# Altium footprint library CONN_TBLOCK_3P5_B.PcbLib: 36 footprints (part 2 of 3)
Each footprint in its own frame and in the unit in brackets; x right, y up, seen from the top. Pads: shape width x height; smd on the part's side, far side on the other; paste and mask are expansions set on the pad; w line width, h text height; cw(c..) or ccw(c..) is an arc to the next point about the centre after c.
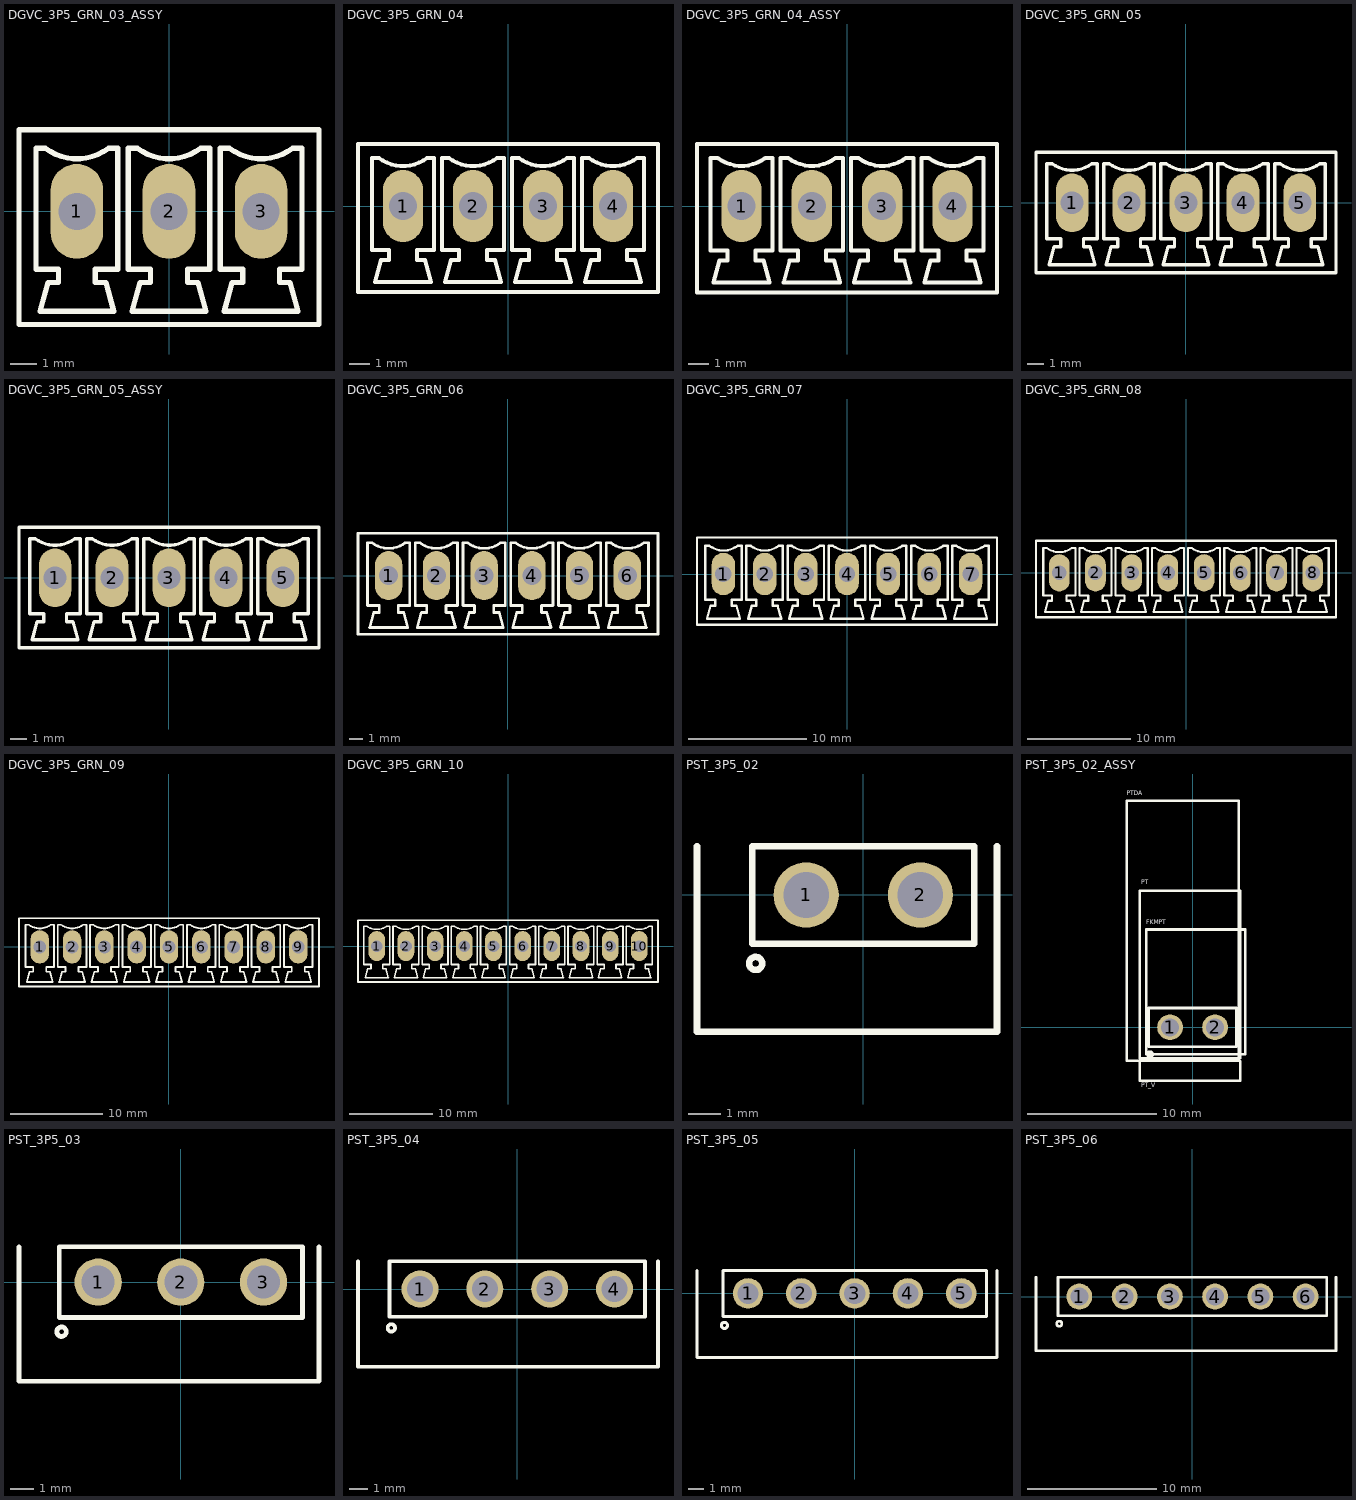
[diagram p1: the footprints below, top view; thin cyan lines are the x and y axes]

## DGVC_3P5_GRN_03_ASSY [mm] "Terminal Block Pluggable, 15EDGVC-3.5-0xP-14, Green, 8A/300v"
pads (3):
  oval 2x3.6 hole 1.4: 1(-3.5,0) 2(0,0) 3(3.5,0)
Top Overlay:
  lines w0.2: -4.25,-2.2 -5.05,-2.2 -5.05,2.4 -4.7,2.4 ccw(c-3.5,4) -2.3,2.4 -1.95,2.4 -1.95,-2.2 -2.8,-2.2 -2.8,-2.7 -2.4,-2.7 -2.1,-3.8 -4.9,-3.8 -4.6,-2.7 -4.2,-2.7 -4.2,-2.2 ; -0.75,-2.2 -1.55,-2.2 -1.55,2.4 -1.2,2.4 ccw(c0,4) 1.2,2.4 1.55,2.4 1.55,-2.2 0.7,-2.2 0.7,-2.7 1.1,-2.7 1.4,-3.8 -1.4,-3.8 -1.1,-2.7 -0.7,-2.7 -0.7,-2.2 ; 2.75,-2.2 1.95,-2.2 1.95,2.4 2.3,2.4 ccw(c3.5,4) 4.7,2.4 5.05,2.4 5.05,-2.2 4.2,-2.2 4.2,-2.7 4.6,-2.7 4.9,-3.8 2.1,-3.8 2.4,-2.7 2.8,-2.7 2.8,-2.2 ; -5.7,-4.3 5.7,-4.3 5.7,3.1 -5.7,3.1 -5.7,-4.3
3D body "15EDG-3.5-3P(V-Hhb).STEP": height 21.7, standoff -3.6, extent -5.678,-5.108 5.622,5.292

## DGVC_3P5_GRN_04 [mm] "Terminal Block Pluggable, 15EDGVC-3.5-0xP-14, Green, 8A/300v"
pads (4):
  oval 2x3.6 hole 1.4: 1(-5.25,0) 2(-1.75,0) 3(1.75,0) 4(5.25,0)
Top Overlay:
  lines w0.2: -6,-2.2 -6.8,-2.2 -6.8,2.4 -6.45,2.4 ccw(c-5.25,4) -4.05,2.4 -3.7,2.4 -3.7,-2.2 -4.55,-2.2 -4.55,-2.7 -4.15,-2.7 -3.85,-3.8 -6.65,-3.8 -6.35,-2.7 -5.95,-2.7 -5.95,-2.2 ; -2.5,-2.2 -3.3,-2.2 -3.3,2.4 -2.95,2.4 ccw(c-1.75,4) -0.55,2.4 -0.2,2.4 -0.2,-2.2 -1.05,-2.2 -1.05,-2.7 -0.65,-2.7 -0.35,-3.8 -3.15,-3.8 -2.85,-2.7 -2.45,-2.7 -2.45,-2.2 ; 1,-2.2 0.2,-2.2 0.2,2.4 0.55,2.4 ccw(c1.75,4) 2.95,2.4 3.3,2.4 3.3,-2.2 2.45,-2.2 2.45,-2.7 2.85,-2.7 3.15,-3.8 0.35,-3.8 0.65,-2.7 1.05,-2.7 1.05,-2.2 ; 4.5,-2.2 3.7,-2.2 3.7,2.4 4.05,2.4 ccw(c5.25,4) 6.45,2.4 6.8,2.4 6.8,-2.2 5.95,-2.2 5.95,-2.7 6.35,-2.7 6.65,-3.8 3.85,-3.8 4.15,-2.7 4.55,-2.7 4.55,-2.2 ; -7.5,-4.3 7.5,-4.3 7.5,3.1 -7.5,3.1 -7.5,-4.3
3D body "15EDGVC-3.5-04P-14-00AH.STEP": height 9.2, standoff -3.6, extent -7.403,-4.235 7.397,2.965

## DGVC_3P5_GRN_04_ASSY [mm] "Terminal Block Pluggable, 15EDGVC-3.5-0xP-14, Green, 8A/300v"
pads (4):
  oval 2x3.6 hole 1.4: 1(-5.25,0) 2(-1.75,0) 3(1.75,0) 4(5.25,0)
Top Overlay:
  lines w0.2: -6,-2.2 -6.8,-2.2 -6.8,2.4 -6.45,2.4 ccw(c-5.25,4) -4.05,2.4 -3.7,2.4 -3.7,-2.2 -4.55,-2.2 -4.55,-2.7 -4.15,-2.7 -3.85,-3.8 -6.65,-3.8 -6.35,-2.7 -5.95,-2.7 -5.95,-2.2 ; -2.5,-2.2 -3.3,-2.2 -3.3,2.4 -2.95,2.4 ccw(c-1.75,4) -0.55,2.4 -0.2,2.4 -0.2,-2.2 -1.05,-2.2 -1.05,-2.7 -0.65,-2.7 -0.35,-3.8 -3.15,-3.8 -2.85,-2.7 -2.45,-2.7 -2.45,-2.2 ; 1,-2.2 0.2,-2.2 0.2,2.4 0.55,2.4 ccw(c1.75,4) 2.95,2.4 3.3,2.4 3.3,-2.2 2.45,-2.2 2.45,-2.7 2.85,-2.7 3.15,-3.8 0.35,-3.8 0.65,-2.7 1.05,-2.7 1.05,-2.2 ; 4.5,-2.2 3.7,-2.2 3.7,2.4 4.05,2.4 ccw(c5.25,4) 6.45,2.4 6.8,2.4 6.8,-2.2 5.95,-2.2 5.95,-2.7 6.35,-2.7 6.65,-3.8 3.85,-3.8 4.15,-2.7 4.55,-2.7 4.55,-2.2 ; -7.465,-4.3 7.465,-4.3 7.465,3.1 -7.465,3.1 -7.465,-4.3
3D body "15EDG-3.5-4P(V-Hhb).STEP": height 21.7, standoff -3.6, extent -7.401,-5.235 7.399,5.165

## DGVC_3P5_GRN_05 [mm] "Terminal Block Pluggable, 15EDGVC-3.5-0xP-14, Green, 8A/300v"
pads (5):
  oval 2x3.6 hole 1.4: 1(-7,0) 2(-3.5,0) 3(0,0) 4(3.5,0) 5(7,0)
Top Overlay:
  lines w0.2: -7.75,-2.2 -8.55,-2.2 -8.55,2.4 -8.2,2.4 ccw(c-7,4) -5.8,2.4 -5.45,2.4 -5.45,-2.2 -6.3,-2.2 -6.3,-2.7 -5.9,-2.7 -5.6,-3.8 -8.4,-3.8 -8.1,-2.7 -7.7,-2.7 -7.7,-2.2 ; -4.25,-2.2 -5.05,-2.2 -5.05,2.4 -4.7,2.4 ccw(c-3.5,4) -2.3,2.4 -1.95,2.4 -1.95,-2.2 -2.8,-2.2 -2.8,-2.7 -2.4,-2.7 -2.1,-3.8 -4.9,-3.8 -4.6,-2.7 -4.2,-2.7 -4.2,-2.2 ; -0.75,-2.2 -1.55,-2.2 -1.55,2.4 -1.2,2.4 ccw(c0,4) 1.2,2.4 1.55,2.4 1.55,-2.2 0.7,-2.2 0.7,-2.7 1.1,-2.7 1.4,-3.8 -1.4,-3.8 -1.1,-2.7 -0.7,-2.7 -0.7,-2.2 ; 2.75,-2.2 1.95,-2.2 1.95,2.4 2.3,2.4 ccw(c3.5,4) 4.7,2.4 5.05,2.4 5.05,-2.2 4.2,-2.2 4.2,-2.7 4.6,-2.7 4.9,-3.8 2.1,-3.8 2.4,-2.7 2.8,-2.7 2.8,-2.2 ; 6.25,-2.2 5.45,-2.2 5.45,2.4 5.8,2.4 ccw(c7,4) 8.2,2.4 8.55,2.4 8.55,-2.2 7.7,-2.2 7.7,-2.7 8.1,-2.7 8.4,-3.8 5.6,-3.8 5.9,-2.7 6.3,-2.7 6.3,-2.2 ; -9.215,-4.3 9.215,-4.3 9.215,3.1 -9.215,3.1 -9.215,-4.3
3D body "15EDGVC-3.5-05P-14-00AH.STEP": height 9.2, standoff -3.6, extent -9.151,-4.21 9.149,2.99

## DGVC_3P5_GRN_05_ASSY [mm] "Terminal Block Pluggable, 15EDGVC-3.5-0xP-14, Green, 8A/300v"
pads (5):
  oval 2x3.6 hole 1.4: 1(-7,0) 2(-3.5,0) 3(0,0) 4(3.5,0) 5(7,0)
Top Overlay:
  lines w0.2: -7.75,-2.2 -8.55,-2.2 -8.55,2.4 -8.2,2.4 ccw(c-7,4) -5.8,2.4 -5.45,2.4 -5.45,-2.2 -6.3,-2.2 -6.3,-2.7 -5.9,-2.7 -5.6,-3.8 -8.4,-3.8 -8.1,-2.7 -7.7,-2.7 -7.7,-2.2 ; -4.25,-2.2 -5.05,-2.2 -5.05,2.4 -4.7,2.4 ccw(c-3.5,4) -2.3,2.4 -1.95,2.4 -1.95,-2.2 -2.8,-2.2 -2.8,-2.7 -2.4,-2.7 -2.1,-3.8 -4.9,-3.8 -4.6,-2.7 -4.2,-2.7 -4.2,-2.2 ; -0.75,-2.2 -1.55,-2.2 -1.55,2.4 -1.2,2.4 ccw(c0,4) 1.2,2.4 1.55,2.4 1.55,-2.2 0.7,-2.2 0.7,-2.7 1.1,-2.7 1.4,-3.8 -1.4,-3.8 -1.1,-2.7 -0.7,-2.7 -0.7,-2.2 ; 2.75,-2.2 1.95,-2.2 1.95,2.4 2.3,2.4 ccw(c3.5,4) 4.7,2.4 5.05,2.4 5.05,-2.2 4.2,-2.2 4.2,-2.7 4.6,-2.7 4.9,-3.8 2.1,-3.8 2.4,-2.7 2.8,-2.7 2.8,-2.2 ; 6.25,-2.2 5.45,-2.2 5.45,2.4 5.8,2.4 ccw(c7,4) 8.2,2.4 8.55,2.4 8.55,-2.2 7.7,-2.2 7.7,-2.7 8.1,-2.7 8.4,-3.8 5.6,-3.8 5.9,-2.7 6.3,-2.7 6.3,-2.2 ; -9.215,-4.3 -9.215,3.1 9.215,3.1 9.215,-4.3 -9.215,-4.3
3D body "15EDG-3.5-5P(V-Hhb).STEP": height 21.7, standoff -3.6, extent -9.135,-5.207 9.165,5.193

## DGVC_3P5_GRN_06 [mm] "Terminal Block Pluggable, 15EDGVC-3.5-0xP-14, Green, 8A/300v"
pads (6):
  oval 2x3.6 hole 1.4: 1(-8.75,0) 2(-5.25,0) 3(-1.75,0) 4(1.75,0) 5(5.25,0) 6(8.75,0)
Top Overlay:
  lines w0.2: -9.5,-2.2 -10.3,-2.2 -10.3,2.4 -9.95,2.4 ccw(c-8.75,4) -7.55,2.4 -7.2,2.4 -7.2,-2.2 -8.05,-2.2 -8.05,-2.7 -7.65,-2.7 -7.35,-3.8 -10.15,-3.8 -9.85,-2.7 -9.45,-2.7 -9.45,-2.2 ; -6,-2.2 -6.8,-2.2 -6.8,2.4 -6.45,2.4 ccw(c-5.25,4) -4.05,2.4 -3.7,2.4 -3.7,-2.2 -4.55,-2.2 -4.55,-2.7 -4.15,-2.7 -3.85,-3.8 -6.65,-3.8 -6.35,-2.7 -5.95,-2.7 -5.95,-2.2 ; -2.5,-2.2 -3.3,-2.2 -3.3,2.4 -2.95,2.4 ccw(c-1.75,4) -0.55,2.4 -0.2,2.4 -0.2,-2.2 -1.05,-2.2 -1.05,-2.7 -0.65,-2.7 -0.35,-3.8 -3.15,-3.8 -2.85,-2.7 -2.45,-2.7 -2.45,-2.2 ; 1,-2.2 0.2,-2.2 0.2,2.4 0.55,2.4 ccw(c1.75,4) 2.95,2.4 3.3,2.4 3.3,-2.2 2.45,-2.2 2.45,-2.7 2.85,-2.7 3.15,-3.8 0.35,-3.8 0.65,-2.7 1.05,-2.7 1.05,-2.2 ; 4.5,-2.2 3.7,-2.2 3.7,2.4 4.05,2.4 ccw(c5.25,4) 6.45,2.4 6.8,2.4 6.8,-2.2 5.95,-2.2 5.95,-2.7 6.35,-2.7 6.65,-3.8 3.85,-3.8 4.15,-2.7 4.55,-2.7 4.55,-2.2 ; 8,-2.2 7.2,-2.2 7.2,2.4 7.55,2.4 ccw(c8.75,4) 9.95,2.4 10.3,2.4 10.3,-2.2 9.45,-2.2 9.45,-2.7 9.85,-2.7 10.15,-3.8 7.35,-3.8 7.65,-2.7 8.05,-2.7 8.05,-2.2 ; -11,-4.3 11,-4.3 11,3.1 -11,3.1 -11,-4.3
3D body "15EDGVC-3.5-03P-14-00AH.STEP": height 9.2, standoff -3.6, extent -0.403,-4.208 10.897,2.992
3D body "15EDGVC-3.5-03P-14-00AH.STEP": height 9.2, standoff -3.6, extent -10.903,-4.208 0.397,2.992

## DGVC_3P5_GRN_07 [mm] "Terminal Block Pluggable, 15EDGVC-3.5-0xP-14, Green, 8A/300v"
pads (7):
  oval 2x3.6 hole 1.4: 1(-10.5,0) 2(-7,0) 3(-3.5,0) 4(0,0) 5(3.5,0) 6(7,0) 7(10.5,0)
Top Overlay:
  lines w0.2: -11.25,-2.2 -12.05,-2.2 -12.05,2.4 -11.7,2.4 ccw(c-10.5,4) -9.3,2.4 -8.95,2.4 -8.95,-2.2 -9.8,-2.2 -9.8,-2.7 -9.4,-2.7 -9.1,-3.8 -11.9,-3.8 -11.6,-2.7 -11.2,-2.7 -11.2,-2.2 ; -7.75,-2.2 -8.55,-2.2 -8.55,2.4 -8.2,2.4 ccw(c-7,4) -5.8,2.4 -5.45,2.4 -5.45,-2.2 -6.3,-2.2 -6.3,-2.7 -5.9,-2.7 -5.6,-3.8 -8.4,-3.8 -8.1,-2.7 -7.7,-2.7 -7.7,-2.2 ; -4.25,-2.2 -5.05,-2.2 -5.05,2.4 -4.7,2.4 ccw(c-3.5,4) -2.3,2.4 -1.95,2.4 -1.95,-2.2 -2.8,-2.2 -2.8,-2.7 -2.4,-2.7 -2.1,-3.8 -4.9,-3.8 -4.6,-2.7 -4.2,-2.7 -4.2,-2.2 ; -0.75,-2.2 -1.55,-2.2 -1.55,2.4 -1.2,2.4 ccw(c0,4) 1.2,2.4 1.55,2.4 1.55,-2.2 0.7,-2.2 0.7,-2.7 1.1,-2.7 1.4,-3.8 -1.4,-3.8 -1.1,-2.7 -0.7,-2.7 -0.7,-2.2 ; 2.75,-2.2 1.95,-2.2 1.95,2.4 2.3,2.4 ccw(c3.5,4) 4.7,2.4 5.05,2.4 5.05,-2.2 4.2,-2.2 4.2,-2.7 4.6,-2.7 4.9,-3.8 2.1,-3.8 2.4,-2.7 2.8,-2.7 2.8,-2.2 ; 6.25,-2.2 5.45,-2.2 5.45,2.4 5.8,2.4 ccw(c7,4) 8.2,2.4 8.55,2.4 8.55,-2.2 7.7,-2.2 7.7,-2.7 8.1,-2.7 8.4,-3.8 5.6,-3.8 5.9,-2.7 6.3,-2.7 6.3,-2.2 ; 9.75,-2.2 8.95,-2.2 8.95,2.4 9.3,2.4 ccw(c10.5,4) 11.7,2.4 12.05,2.4 12.05,-2.2 11.2,-2.2 11.2,-2.7 11.6,-2.7 11.9,-3.8 9.1,-3.8 9.4,-2.7 9.8,-2.7 9.8,-2.2 ; -12.75,-4.3 -12.75,3.1 12.75,3.1 12.75,-4.3 -12.75,-4.3
3D body "15EDGVC-3.5-04P-14-00AH.STEP": height 9.2, standoff -3.6, extent -12.653,-4.235 2.147,2.965
3D body "15EDGVC-3.5-03P-14-00AH.STEP": height 9.2, standoff -3.6, extent 1.347,-4.208 12.647,2.992

## DGVC_3P5_GRN_08 [mm] "Terminal Block Pluggable, 15EDGVC-3.5-0xP-14, Green, 8A/300v"
pads (8):
  oval 2x3.6 hole 1.4: 1(-12.25,0) 2(-8.75,0) 3(-5.25,0) 4(-1.75,0) 5(1.75,0) 6(5.25,0) 7(8.75,0) 8(12.25,0)
Top Overlay:
  lines w0.2: -13,-2.2 -13.8,-2.2 -13.8,2.4 -13.45,2.4 ccw(c-12.25,4) -11.05,2.4 -10.7,2.4 -10.7,-2.2 -11.55,-2.2 -11.55,-2.7 -11.15,-2.7 -10.85,-3.8 -13.65,-3.8 -13.35,-2.7 -12.95,-2.7 -12.95,-2.2 ; -9.5,-2.2 -10.3,-2.2 -10.3,2.4 -9.95,2.4 ccw(c-8.75,4) -7.55,2.4 -7.2,2.4 -7.2,-2.2 -8.05,-2.2 -8.05,-2.7 -7.65,-2.7 -7.35,-3.8 -10.15,-3.8 -9.85,-2.7 -9.45,-2.7 -9.45,-2.2 ; -6,-2.2 -6.8,-2.2 -6.8,2.4 -6.45,2.4 ccw(c-5.25,4) -4.05,2.4 -3.7,2.4 -3.7,-2.2 -4.55,-2.2 -4.55,-2.7 -4.15,-2.7 -3.85,-3.8 -6.65,-3.8 -6.35,-2.7 -5.95,-2.7 -5.95,-2.2 ; -2.5,-2.2 -3.3,-2.2 -3.3,2.4 -2.95,2.4 ccw(c-1.75,4) -0.55,2.4 -0.2,2.4 -0.2,-2.2 -1.05,-2.2 -1.05,-2.7 -0.65,-2.7 -0.35,-3.8 -3.15,-3.8 -2.85,-2.7 -2.45,-2.7 -2.45,-2.2 ; 1,-2.2 0.2,-2.2 0.2,2.4 0.55,2.4 ccw(c1.75,4) 2.95,2.4 3.3,2.4 3.3,-2.2 2.45,-2.2 2.45,-2.7 2.85,-2.7 3.15,-3.8 0.35,-3.8 0.65,-2.7 1.05,-2.7 1.05,-2.2 ; 4.5,-2.2 3.7,-2.2 3.7,2.4 4.05,2.4 ccw(c5.25,4) 6.45,2.4 6.8,2.4 6.8,-2.2 5.95,-2.2 5.95,-2.7 6.35,-2.7 6.65,-3.8 3.85,-3.8 4.15,-2.7 4.55,-2.7 4.55,-2.2 ; 8,-2.2 7.2,-2.2 7.2,2.4 7.55,2.4 ccw(c8.75,4) 9.95,2.4 10.3,2.4 10.3,-2.2 9.45,-2.2 9.45,-2.7 9.85,-2.7 10.15,-3.8 7.35,-3.8 7.65,-2.7 8.05,-2.7 8.05,-2.2 ; 11.5,-2.2 10.7,-2.2 10.7,2.4 11.05,2.4 ccw(c12.25,4) 13.45,2.4 13.8,2.4 13.8,-2.2 12.95,-2.2 12.95,-2.7 13.35,-2.7 13.65,-3.8 10.85,-3.8 11.15,-2.7 11.55,-2.7 11.55,-2.2 ; -14.5,-4.3 14.5,-4.3 14.5,3.1 -14.5,3.1 -14.5,-4.3
3D body "15EDGVC-3.5-04P-14-00AH.STEP": height 9.2, standoff -3.6, extent -0.403,-4.235 14.397,2.965
3D body "15EDGVC-3.5-04P-14-00AH.STEP": height 9.2, standoff -3.6, extent -14.403,-4.235 0.397,2.965

## DGVC_3P5_GRN_09 [mm] "Terminal Block Pluggable, 15EDGVC-3.5-0xP-14, Green, 8A/300v"
pads (9):
  oval 2x3.6 hole 1.4: 1(-14,0) 2(-10.5,0) 3(-7,0) 4(-3.5,0) 5(0,0) 6(3.5,0) 7(7,0) 8(10.5,0) 9(14,0)
Top Overlay:
  lines w0.2: -14.75,-2.2 -15.55,-2.2 -15.55,2.4 -15.2,2.4 ccw(c-14,4) -12.8,2.4 -12.45,2.4 -12.45,-2.2 -13.3,-2.2 -13.3,-2.7 -12.9,-2.7 -12.6,-3.8 -15.4,-3.8 -15.1,-2.7 -14.7,-2.7 -14.7,-2.2 ; -11.25,-2.2 -12.05,-2.2 -12.05,2.4 -11.7,2.4 ccw(c-10.5,4) -9.3,2.4 -8.95,2.4 -8.95,-2.2 -9.8,-2.2 -9.8,-2.7 -9.4,-2.7 -9.1,-3.8 -11.9,-3.8 -11.6,-2.7 -11.2,-2.7 -11.2,-2.2 ; -7.75,-2.2 -8.55,-2.2 -8.55,2.4 -8.2,2.4 ccw(c-7,4) -5.8,2.4 -5.45,2.4 -5.45,-2.2 -6.3,-2.2 -6.3,-2.7 -5.9,-2.7 -5.6,-3.8 -8.4,-3.8 -8.1,-2.7 -7.7,-2.7 -7.7,-2.2 ; -4.25,-2.2 -5.05,-2.2 -5.05,2.4 -4.7,2.4 ccw(c-3.5,4) -2.3,2.4 -1.95,2.4 -1.95,-2.2 -2.8,-2.2 -2.8,-2.7 -2.4,-2.7 -2.1,-3.8 -4.9,-3.8 -4.6,-2.7 -4.2,-2.7 -4.2,-2.2 ; -0.75,-2.2 -1.55,-2.2 -1.55,2.4 -1.2,2.4 ccw(c0,4) 1.2,2.4 1.55,2.4 1.55,-2.2 0.7,-2.2 0.7,-2.7 1.1,-2.7 1.4,-3.8 -1.4,-3.8 -1.1,-2.7 -0.7,-2.7 -0.7,-2.2 ; 2.75,-2.2 1.95,-2.2 1.95,2.4 2.3,2.4 ccw(c3.5,4) 4.7,2.4 5.05,2.4 5.05,-2.2 4.2,-2.2 4.2,-2.7 4.6,-2.7 4.9,-3.8 2.1,-3.8 2.4,-2.7 2.8,-2.7 2.8,-2.2 ; 6.25,-2.2 5.45,-2.2 5.45,2.4 5.8,2.4 ccw(c7,4) 8.2,2.4 8.55,2.4 8.55,-2.2 7.7,-2.2 7.7,-2.7 8.1,-2.7 8.4,-3.8 5.6,-3.8 5.9,-2.7 6.3,-2.7 6.3,-2.2 ; 9.75,-2.2 8.95,-2.2 8.95,2.4 9.3,2.4 ccw(c10.5,4) 11.7,2.4 12.05,2.4 12.05,-2.2 11.2,-2.2 11.2,-2.7 11.6,-2.7 11.9,-3.8 9.1,-3.8 9.4,-2.7 9.8,-2.7 9.8,-2.2 ; 13.25,-2.2 12.45,-2.2 12.45,2.4 12.8,2.4 ccw(c14,4) 15.2,2.4 15.55,2.4 15.55,-2.2 14.7,-2.2 14.7,-2.7 15.1,-2.7 15.4,-3.8 12.6,-3.8 12.9,-2.7 13.3,-2.7 13.3,-2.2 ; -16.25,-4.3 -16.25,3.1 16.25,3.1 16.25,-4.3 -16.25,-4.3
3D body "15EDGVC-3.5-05P-14-00AH.STEP": height 9.2, standoff -3.6, extent -16.126,-4.235 2.174,2.965
3D body "15EDGVC-3.5-04P-14-00AH.STEP": height 9.2, standoff -3.6, extent 1.347,-4.235 16.147,2.965

## DGVC_3P5_GRN_10 [mm] "Terminal Block Pluggable, 15EDGVC-3.5-0xP-14, Green, 8A/300v"
pads (10):
  oval 2x3.6 hole 1.4: 1(-15.75,0) 2(-12.25,0) 3(-8.75,0) 4(-5.25,0) 5(-1.75,0) 6(1.75,0) 7(5.25,0) 8(8.75,0) 9(12.25,0) 10(15.75,0)
Top Overlay:
  lines w0.2: -16.5,-2.2 -17.3,-2.2 -17.3,2.4 -16.95,2.4 ccw(c-15.75,4) -14.55,2.4 -14.2,2.4 -14.2,-2.2 -15.05,-2.2 -15.05,-2.7 -14.65,-2.7 -14.35,-3.8 -17.15,-3.8 -16.85,-2.7 -16.45,-2.7 -16.45,-2.2 ; -13,-2.2 -13.8,-2.2 -13.8,2.4 -13.45,2.4 ccw(c-12.25,4) -11.05,2.4 -10.7,2.4 -10.7,-2.2 -11.55,-2.2 -11.55,-2.7 -11.15,-2.7 -10.85,-3.8 -13.65,-3.8 -13.35,-2.7 -12.95,-2.7 -12.95,-2.2 ; -9.5,-2.2 -10.3,-2.2 -10.3,2.4 -9.95,2.4 ccw(c-8.75,4) -7.55,2.4 -7.2,2.4 -7.2,-2.2 -8.05,-2.2 -8.05,-2.7 -7.65,-2.7 -7.35,-3.8 -10.15,-3.8 -9.85,-2.7 -9.45,-2.7 -9.45,-2.2 ; -6,-2.2 -6.8,-2.2 -6.8,2.4 -6.45,2.4 ccw(c-5.25,4) -4.05,2.4 -3.7,2.4 -3.7,-2.2 -4.55,-2.2 -4.55,-2.7 -4.15,-2.7 -3.85,-3.8 -6.65,-3.8 -6.35,-2.7 -5.95,-2.7 -5.95,-2.2 ; -2.5,-2.2 -3.3,-2.2 -3.3,2.4 -2.95,2.4 ccw(c-1.75,4) -0.55,2.4 -0.2,2.4 -0.2,-2.2 -1.05,-2.2 -1.05,-2.7 -0.65,-2.7 -0.35,-3.8 -3.15,-3.8 -2.85,-2.7 -2.45,-2.7 -2.45,-2.2 ; 1,-2.2 0.2,-2.2 0.2,2.4 0.55,2.4 ccw(c1.75,4) 2.95,2.4 3.3,2.4 3.3,-2.2 2.45,-2.2 2.45,-2.7 2.85,-2.7 3.15,-3.8 0.35,-3.8 0.65,-2.7 1.05,-2.7 1.05,-2.2 ; 4.5,-2.2 3.7,-2.2 3.7,2.4 4.05,2.4 ccw(c5.25,4) 6.45,2.4 6.8,2.4 6.8,-2.2 5.95,-2.2 5.95,-2.7 6.35,-2.7 6.65,-3.8 3.85,-3.8 4.15,-2.7 4.55,-2.7 4.55,-2.2 ; 8,-2.2 7.2,-2.2 7.2,2.4 7.55,2.4 ccw(c8.75,4) 9.95,2.4 10.3,2.4 10.3,-2.2 9.45,-2.2 9.45,-2.7 9.85,-2.7 10.15,-3.8 7.35,-3.8 7.65,-2.7 8.05,-2.7 8.05,-2.2 ; 11.5,-2.2 10.7,-2.2 10.7,2.4 11.05,2.4 ccw(c12.25,4) 13.45,2.4 13.8,2.4 13.8,-2.2 12.95,-2.2 12.95,-2.7 13.35,-2.7 13.65,-3.8 10.85,-3.8 11.15,-2.7 11.55,-2.7 11.55,-2.2 ; 15,-2.2 14.2,-2.2 14.2,2.4 14.55,2.4 ccw(c15.75,4) 16.95,2.4 17.3,2.4 17.3,-2.2 16.45,-2.2 16.45,-2.7 16.85,-2.7 17.15,-3.8 14.35,-3.8 14.65,-2.7 15.05,-2.7 15.05,-2.2 ; -18,-4.3 18,-4.3 18,3.1 -18,3.1 -18,-4.3
3D body "15EDGVC-3.5-05P-14-00AH.STEP": height 9.2, standoff -3.6, extent -17.876,-4.235 0.424,2.965
3D body "15EDGVC-3.5-05P-14-00AH.STEP": height 9.2, standoff -3.6, extent -0.376,-4.235 17.924,2.965

## PST_3P5_02 [mm] "Terminal pin strip, Pitch 3.5mm, PST 1,0/ x-3,5"
height 9.2
pads (2):
  round 2 / inner round 2 / far side rect 2.5x3 hole 1.4: 1(-1.75,0)
  round 2 / inner round 2 / far side oval 2.5x3 hole 1.4: 2(1.75,0)
Top Overlay:
  circle w0.2: c-3.3,-2.1 r0.2
  lines w0.2: -5.1,1.5 -5.1,-4.2 4.1,-4.2 4.1,1.5 ; -3.4,-1.5 3.4,-1.5 3.4,1.5 -3.4,1.5 -3.4,-1.5
3D body "PST-1-0-2-3-5.stp": height 9.1, standoff -3.9, extent -3.298,-1.4 3.302,1.4

## PST_3P5_02_ASSY [mm] "Terminal pin strip, Pitch 3.5mm, PST 1,0/ x-3,5"
height 9.2
pads (2):
  round 2 / inner round 2 / far side rect 2.5x3 hole 1.4: 1(-1.75,0)
  round 2 / inner round 2 / far side oval 2.5x3 hole 1.4: 2(1.75,0)
Top Overlay:
  circle w0.2: c-3.3,-2.1 r0.2
  lines w0.2: -4.1,-2.65 -4.1,-4.15 3.7,-4.15 3.7,-2.65 ; -5.1,-2.6 3.6,-2.6 3.6,17.6 -5.1,17.6 -5.1,-2.6 ; -4.1,-2.4 -4.1,10.6 3.7,10.6 3.7,-2.4 -4.1,-2.4 ; -3.6,-2.1 -3.6,7.6 4.1,7.6 4.1,-2.1 -3.6,-2.1 ; -3.4,-1.5 3.4,-1.5 3.4,1.5 -3.4,1.5 -3.4,-1.5
  text "PT" at -4,11 h0.6
  text "FKMPT" at -3.6,7.9 h0.6
  text "PT_V" at -4,-4.794 h0.6
  text "PTDA" at -5.118,17.913 h0.6
Mechanical 13:
  text "PT" at -13.912,10.77 h0.6
  text "FKMPT" at 6.5,7.8 h0.6
  text "PT_V" at -24.005,-4.807 h0.6
3D body "PTDA-1-5-2-PH-3-5.stp": height 16.09, standoff 0.09, extent -4.975,-2.489 3.525,17.511
3D body "PT-1-5-2-PH-3-5.stp": height 11.1, standoff 0, extent -14.05,-2.325 -6.35,10.525
3D body "PST-1-0-2-3-5.stp": height 9.1, standoff -3.9, extent -3.298,-1.4 3.302,1.4
3D body "FK-MPT-0-5-2-ST-3-5.stp": height 10.7, standoff 2.2, extent 6.501,-2 13.999,7.497
3D body "PT-1-5-2-PVH-3-5.stp": height 11.1, standoff 0, extent -24.044,-4.047 -16.344,10.553

## PST_3P5_03 [mm] "Terminal pin strip, Pitch 3.5mm, PST 1,0/ x-3,5"
height 9.2
pads (3):
  round 2 / inner round 2 / far side rect 2.5x3 hole 1.4: 1(-3.5,0)
  round 2 / inner round 2 / far side oval 2.5x3 hole 1.4: 2(0,0) 3(3.5,0)
Top Overlay:
  circle w0.2: c-5.05,-2.1 r0.2
  lines w0.2: -6.85,1.5 -6.85,-4.2 5.85,-4.2 5.85,1.5 ; -5.15,-1.5 5.15,-1.5 5.15,1.5 -5.15,1.5 -5.15,-1.5
3D body "PST-1-0-3-3-5.stp": height 9.1, standoff -3.9, extent -5.048,-1.4 5.052,1.4

## PST_3P5_04 [mm] "Terminal pin strip, Pitch 3.5mm, PST 1,0/ x-3,5"
height 9.2
pads (4):
  round 2 / inner round 2 / far side rect 2.5x3 hole 1.4: 1(-5.25,0)
  round 2 / inner round 2 / far side oval 2.5x3 hole 1.4: 2(-1.75,0) 3(1.75,0) 4(5.25,0)
Top Overlay:
  circle w0.2: c-6.8,-2.1 r0.2
  lines w0.2: -8.6,1.5 -8.6,-4.2 7.6,-4.2 7.6,1.5 ; -6.9,-1.5 6.9,-1.5 6.9,1.5 -6.9,1.5 -6.9,-1.5
3D body "PST-1-0-2-3-5.stp": height 9.1, standoff -3.9, extent 0.202,-1.4 6.802,1.4
3D body "PST-1-0-2-3-5.stp": height 9.1, standoff -3.9, extent -6.798,-1.4 -0.198,1.4

## PST_3P5_05 [mm] "Terminal pin strip, Pitch 3.5mm, PST 1,0/ x-3,5"
height 9.2
pads (5):
  round 2 / inner round 2 / far side rect 2.5x3 hole 1.4: 1(-7,0)
  round 2 / inner round 2 / far side oval 2.5x3 hole 1.4: 2(-3.5,0) 3(0,0) 4(3.5,0) 5(7,0)
Top Overlay:
  circle w0.2: c-8.55,-2.1 r0.2
  lines w0.2: -10.35,1.5 -10.35,-4.2 9.35,-4.2 9.35,1.5 ; -8.65,-1.5 -8.65,1.5 8.65,1.5 8.65,-1.5 -8.65,-1.5
3D body "PST-1-0-2-3-5.stp": height 9.1, standoff -3.9, extent -8.548,-1.4 -1.948,1.4
3D body "PST-1-0-3-3-5.stp": height 9.1, standoff -3.9, extent -1.548,-1.4 8.552,1.4

## PST_3P5_06 [mm] "Terminal pin strip, Pitch 3.5mm, PST 1,0/ x-3,5"
height 9.2
pads (6):
  round 2 / inner round 2 / far side rect 2.5x3 hole 1.4: 1(-8.75,0)
  round 2 / inner round 2 / far side oval 2.5x3 hole 1.4: 2(-5.25,0) 3(-1.75,0) 4(1.75,0) 5(5.25,0) 6(8.75,0)
Top Overlay:
  circle w0.2: c-10.3,-2.1 r0.2
  lines w0.2: -12.1,1.5 -12.1,-4.2 11.1,-4.2 11.1,1.5 ; -10.4,-1.5 10.4,-1.5 10.4,1.5 -10.4,1.5 -10.4,-1.5
3D body "PST-1-0-3-3-5.stp": height 9.1, standoff -3.9, extent 0.202,-1.4 10.302,1.4
3D body "PST-1-0-3-3-5.stp": height 9.1, standoff -3.9, extent -10.298,-1.4 -0.198,1.4